# Altium footprint library Footprints.PcbLib: 207 footprints (part 6 of 13)
Each footprint in its own frame and in the unit in brackets; x right, y up, seen from the top. Pads: shape width x height; smd on the part's side, far side on the other; paste and mask are expansions set on the pad; w line width, h text height; cw(c..) or ccw(c..) is an arc to the next point about the centre after c.
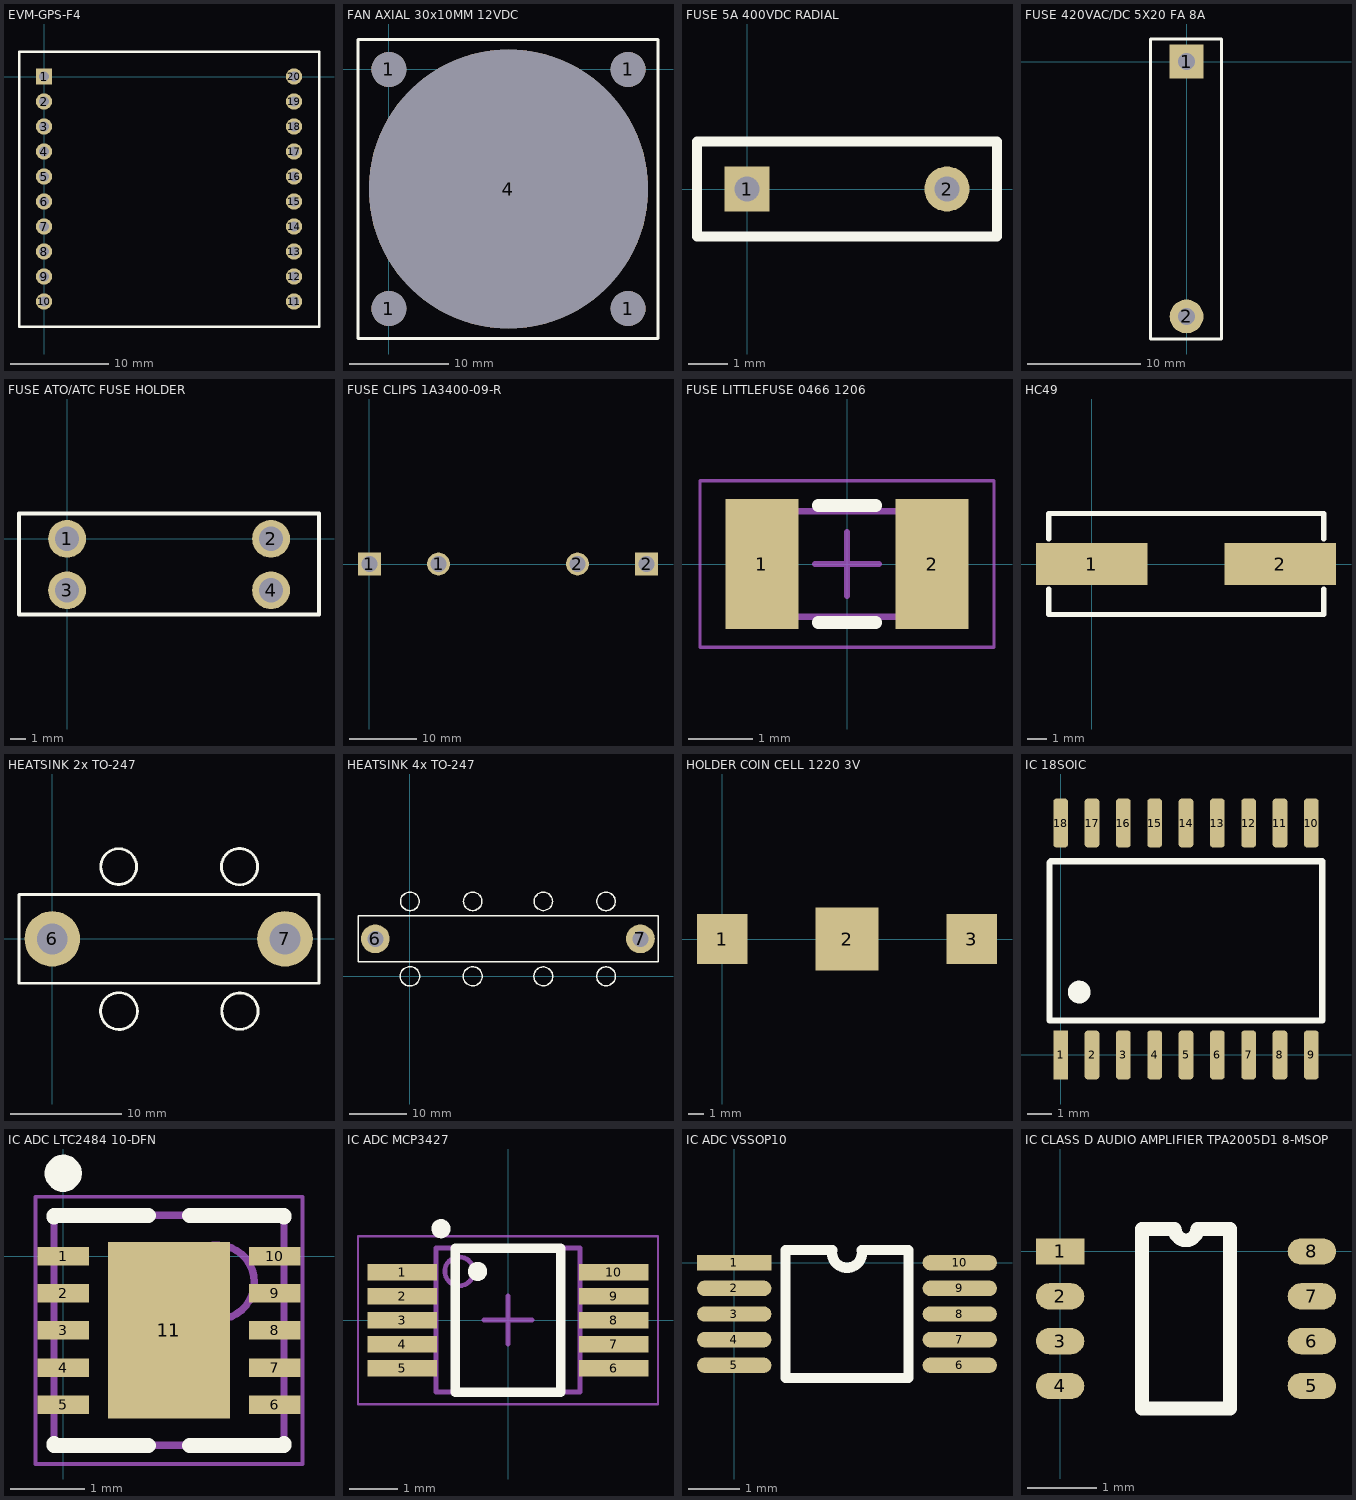
[diagram p5: the footprints below, top view; thin cyan lines are the x and y axes]

## EVM-GPS-F4 [mil] "GPS Module"
pads (20):
  rect 65x65 hole 40: 1(0,0)
  round 65 hole 40: 2(0,-100) 3(0,-200) 4(0,-300) 5(0,-400) 6(0,-500) 7(0,-600) 8(0,-700) 9(0,-800) 10(0,-900) 11(1000,-900) 12(1000,-800) 13(1000,-700) 14(1000,-600) 15(1000,-500) 16(1000,-400) 17(1000,-300) 18(1000,-200) 19(1000,-100) 20(1000,0)
Top Overlay:
  lines w10: -100,-1000 1100,-1000 1100,100 -100,100 -100,-1000

## FAN AXIAL 30x10MM 12VDC [mm]
pads (5):
  round 3.5 hole 3.5: 1(0,-24) 1(0,0) 1(24,-24) 1(24,0)
  round 28 hole 28: 4(12,-12)
Top Overlay:
  lines w0.254: -3.099,-27 -3.099,3 27,3 27,-27 -3.099,-27
3D body "ASB0312LA-CF00.stp": height 10.05, standoff -0.1, extent -3.099,-27 27,3

## FUSE 5A 400VDC RADIAL [mil]
pads (2):
  rect 45x45 hole 25: 1(0,0)
  round 45 hole 25: 2(200,0)
Top Overlay:
  lines w10: -50,-47.5 -50,47.5 250,47.5 250,-47.5 -50,-47.5
3D body: height 320, standoff 25, extent -55,-52.5 255,52.5
3D body: height 40, standoff -80, extent -9.91,-9.97 10.01,9.99
3D body: height 40, standoff -80, extent 190.09,-9.97 210.01,9.99

## FUSE 420VAC/DC 5X20 FA 8A [mm] "8A 420V AC 420V DC Fuse Cartridge, Ceramic Holder Cartridge, Non-Standard"
pads (2):
  rect 3x3 hole 1.5: 1(0,0)
  round 3 hole 1.5: 2(0,-22.6)
Top Overlay:
  lines w0.254: -3.2,-24.6 3.1,-24.6 3.1,2 -3.2,2 -3.2,-24.6
3D body: height 8.13, standoff 0.64, extent -3.2,-24.6 3.1,2

## FUSE ATO/ATC FUSE HOLDER [mm]
pads (4):
  round 2.5 hole 1.6: 1(0,0) 2(13.47,0) 3(0,-3.4) 4(13.47,-3.4)
Top Overlay:
  lines w0.254: -3.18,-4.995 16.64,-4.995 16.64,1.585 ; -3.17,-4.995 -3.17,1.665 16.64,1.665
3D body "fuse-automotive-10a.STEP": height 19.1, standoff 0.1, extent -2.3,-4.1 15.7,0.7
3D body "keystone-PN3557-2.STEP": height 7.54, standoff -2.62, extent -3.234,-4.983 16.578,1.748

## FUSE CLIPS 1A3400-09-R [mm] "FUSE CLIP CARTRIDGE 20A PCB"
pads (4):
  rect 3.4x3.4 hole 2.35: 1(0,0) 2(41.28,0)
  round 3.4 hole 2.35: 1(10.29,0) 2(30.99,0)
3D body: height 18.03, standoff 0, extent 0,-6 41.28,6

## FUSE LITTLEFUSE 0466 1206 [mm]
height 0.6
pads (2):
  rect 1.14x2.03 smd: 1(-1.33,0) 2(1.33,0)
Top Overlay:
  lines w0.2: -0.45,-0.915 0.45,-0.915 ; -0.45,0.915 0.45,0.915
Mechanical 13:
  lines w0.1: -1.65,-0.825 1.65,-0.825 1.65,0.825 -1.65,0.825 -1.65,-0.825
Mechanical 15:
  lines w0.05: -2.3,-1.3 2.3,-1.3 2.3,1.3 -2.3,1.3 -2.3,-1.3
  lines w0.1: -0.5,0 0.5,0 ; 0,-0.5 0,0.5
3D body "FUSE LITTLEFUSE 0466 1206.step": height 0.6, standoff 0, extent -1.65,-0.825 1.65,0.825

## HC49 [mm]
pads (2):
  rect 5.6x2.1 smd: 1(0,0) 2(9.5,0)
Top Overlay:
  lines w0.254: -2.159,-1.27 -2.159,-2.54 11.684,-2.54 11.684,-1.27 ; -2.159,1.27 -2.159,2.54 11.684,2.54 11.684,1.27

## HEATSINK 2x TO-247 [mm]
pads (2):
  round 5 hole 2.775: 6(0,0) 7(20.94,0)
Top Overlay:
  circle w0.254: c5.97,6.5 r1.61
  circle w0.254: c16.85,6.5 r1.629
  circle w0.254: c16.88,-6.5 r1.634
  circle w0.254: c6,-6.5 r1.655
  lines w0.254: -3,-4 -3,4 24,4 24,-4 -3,-4
3D body "omni-uni-30-25-d.stp": height 59.7, standoff -4.15, extent -2,-15.1 23,14.9

## HEATSINK 4x TO-247 [mm]
pads (2):
  round 5 hole 2.775: 6(-6,6.5) 7(39.94,6.5)
Top Overlay:
  circle w0.254: c23.12,13 r1.597
  circle w0.254: c34,13 r1.603
  circle w0.254: c34,0 r1.628
  circle w0.254: c23.12,0 r1.637
  circle w0.254: c10.88,0 r1.648
  circle w0.254: c0,0 r1.676
  circle w0.254: c10.88,13 r1.598
  circle w0.254: c0,13 r1.612
  lines w0.254: -9,2.5 -9,10.5 43,10.5 43,2.5 -9,2.5
3D body "omni-uni-30-50-d.stp": height 59.7, standoff -4.15, extent -8,-8.25 42,21.75

## HOLDER COIN CELL 1220 3V [mm] "12mm smd coin cell holder"
height 3.18
pads (3):
  rect 3.18x3.18 smd: 1(0,0) 3(15.74,0)
  rect 3.96x3.96 smd: 2(7.87,0)
3D body: height 0.25, standoff 0, extent 3.1,-0.9 3.1,-0.9
3D body "keystone-PN3000.STEP": height 3.43, standoff 0.26, extent -1.604,-6.921 17.344,5.144

## IC 18SOIC [mm]
height 2
pads (18):
  rect 0.6x2 smd: 1(0,0)
  rrect50% 0.6x2 smd: 2(1.27,0) 3(2.54,0) 4(3.81,0) 5(5.08,0) 6(6.35,0) 7(7.62,0) 8(8.89,0) 9(10.16,0) 10(10.16,9.4) 11(8.89,9.4) 12(7.62,9.4) 13(6.35,9.4) 14(5.08,9.4) 15(3.81,9.4) 16(2.54,9.4) 17(1.27,9.4) 18(0,9.4)
Top Overlay:
  circle w0.254: c0.75,2.55 r0.1
  circle w0.254: c0.75,2.55 r0.335
  lines w0.254: -0.45,7.8 -0.45,1.4 10.6,1.4 10.6,7.85 -0.4,7.85
3D body "SOIC18 wide.stp": height 2, standoff 0, extent -0.625,-0.382 10.725,9.782

## IC ADC LTC2484 10-DFN [mm]
height 0.8
pads (11):
  rect 0.7x0.25 smd: 1(0,0) 2(0,-0.5) 3(0,-1) 4(0,-1.5) 5(0,-2) 6(2.85,-2) 7(2.85,-1.5) 8(2.85,-1) 9(2.85,-0.5) 10(2.85,0)
  rect 1.65x2.38 smd: 11(1.425,-1)
Top Overlay:
  circle w0.25: c0,1.118 r0.125
  lines w0.2: -0.125,-2.525 -0.125,-2.55 1.15,-2.55 ; -0.125,0.525 -0.125,0.55 1.15,0.55 ; 1.7,-2.55 2.975,-2.55 2.975,-2.525 ; 1.7,0.55 2.975,0.55 2.975,0.525
Mechanical 13:
  circle w0.1: c2.075,-0.35 r0.5
  lines w0.1: -0.125,-2.55 -0.125,0.55 2.975,0.55 2.975,-2.55 -0.125,-2.55
Mechanical 15:
  lines w0.05: -0.375,-2.8 -0.375,0.8 3.225,0.8 3.225,-2.8 -0.375,-2.8
  lines w0.1: 0.925,-1 1.925,-1 ; 1.425,-1.5 1.425,-0.5
3D body "IC ADC LTC2484 10-DFN.step": height 0.8, standoff 0, extent -0.125,-2.55 2.975,0.55

## IC ADC MCP3427 [mm]
height 1.1
pads (10):
  rect 1.45x0.345 smd: 1(-2.2,1) 2(-2.2,0.5) 3(-2.2,0) 4(-2.2,-0.5) 5(-2.2,-1) 6(2.2,-1) 7(2.2,-0.5) 8(2.2,0) 9(2.2,0.5) 10(2.2,1)
Top Overlay:
  circle w0.2: c-1.397,1.905 r0.1
  circle w0.2: c-0.635,1.016 r0.1
  lines w0.2: -1.1,-1.5 -1.1,1.5 1.1,1.5 1.1,-1.5 -1.1,-1.5
Mechanical 13:
  circle w0.1: c-1.016,1.016 r0.3
  lines w0.1: -1.5,-1.5 -1.5,1.5 1.5,1.5 1.5,-1.5 -1.5,-1.5
Mechanical 15:
  lines w0.05: -3.125,-1.75 -3.125,1.75 3.125,1.75 3.125,-1.75 -3.125,-1.75
  lines w0.1: -0.5,0 0.5,0 ; 0,-0.5 0,0.5
3D body "STL?STL?STEP?MSOP10_MC-M.step": height 1.09, standoff 0, extent -2.451,-1.499 2.451,1.499

## IC ADC VSSOP10 [mm]
pads (10):
  rect 1.45x0.3 smd: 1(0,0)
  oval 1.45x0.3 smd: 2(0,-0.5) 3(0,-1) 4(0,-1.5) 5(0,-2) 6(4.4,-2) 7(4.4,-1.5) 8(4.4,-1) 9(4.4,-0.5) 10(4.4,0)
Top Overlay:
  lines w0.2: 1.914,0.246 ccw(c2.2,0.191) 2.486,0.246 ; 1.914,0.25 1,0.25 1,-2.25 3.4,-2.25 3.4,0.25 2.486,0.25
3D body "MSOP-10.stp": height 1.15, standoff 0, extent -0.25,-2.5 4.65,0.5

## IC CLASS D AUDIO AMPLIFIER TPA2005D1 8-MSOP [mm]
pads (8):
  rect 0.7x0.38 smd: 1(0,0)
  oval 0.7x0.38 smd: 2(0,-0.65) 3(0,-1.3) 4(0,-1.95) 5(3.65,-1.95) 6(3.65,-1.3) 7(3.65,-0.65) 8(3.65,0)
Top Overlay:
  lines w0.2: 1.185,-2.275 1.185,0.325 1.663,0.325 ccw(c1.825,0.325) 1.987,0.325 2.465,0.325 2.465,-2.275 1.185,-2.275